# Altium footprint library Connector_Samtec_HLE_SMD.PcbLib: 290 footprints (part 20 of 24)
Each footprint in its own frame and in the unit in brackets; x right, y up, seen from the top. Pads: shape width x height; smd on the part's side, far side on the other; paste and mask are expansions set on the pad; w line width, h text height; cw(c..) or ccw(c..) is an arc to the next point about the centre after c.
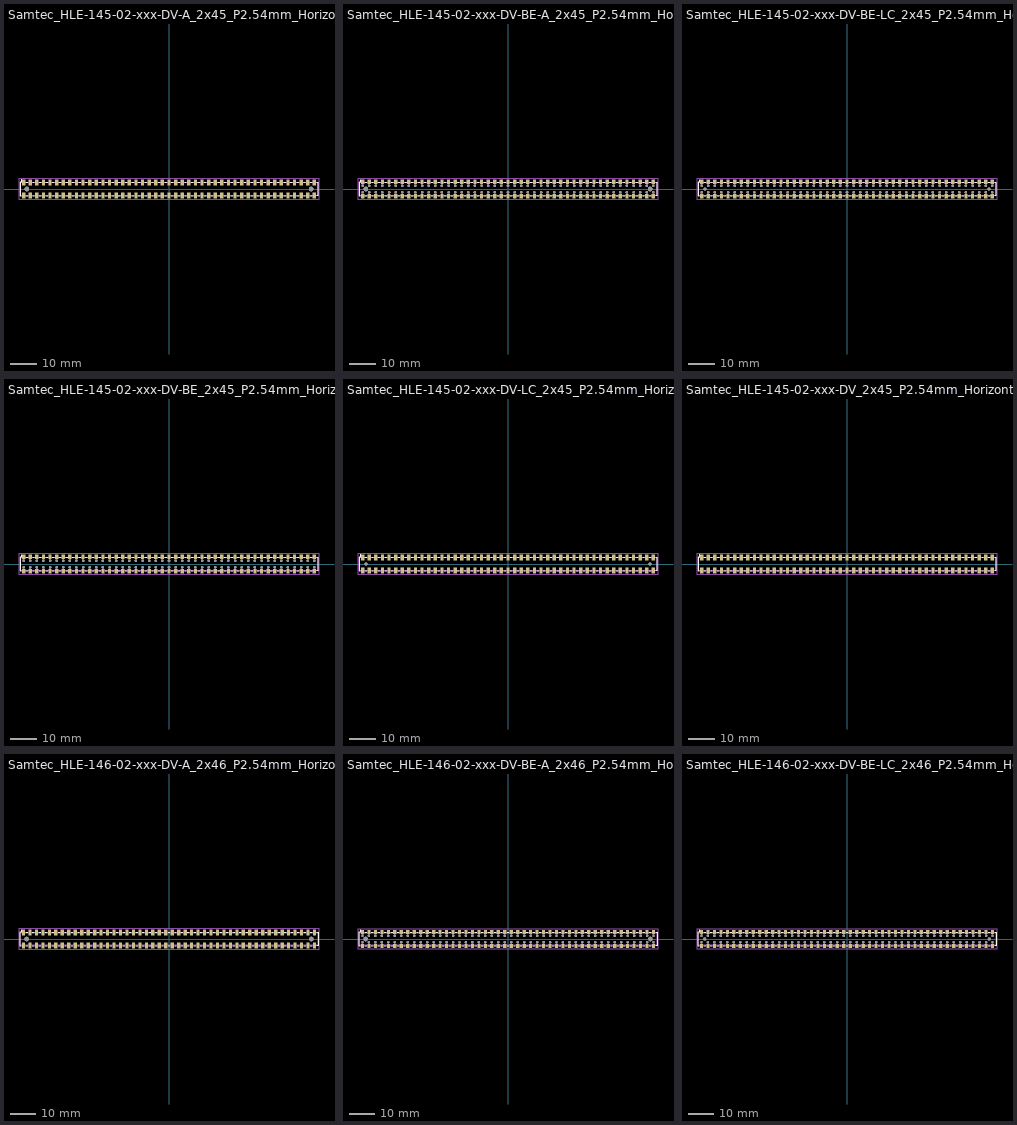
[diagram p19: the footprints below, top view; thin cyan lines are the x and y axes]

## Samtec_HLE-145-02-xxx-DV-A_2x45_P2.54mm_Horizontal [mm]
pads (92):
  rect 1.27x2.29 smd: 1(-55.88,2.525) 2(-55.88,-2.525) 3(-53.34,2.525) 4(-53.34,-2.525) 5(-50.8,2.525) 6(-50.8,-2.525) 7(-48.26,2.525) 8(-48.26,-2.525) 9(-45.72,2.525) 10(-45.72,-2.525) 11(-43.18,2.525) 12(-43.18,-2.525) 13(-40.64,2.525) 14(-40.64,-2.525) 15(-38.1,2.525) 16(-38.1,-2.525) 17(-35.56,2.525) 18(-35.56,-2.525) 19(-33.02,2.525) 20(-33.02,-2.525) 21(-30.48,2.525) 22(-30.48,-2.525) 23(-27.94,2.525) 24(-27.94,-2.525) 25(-25.4,2.525) 26(-25.4,-2.525) 27(-22.86,2.525) 28(-22.86,-2.525) 29(-20.32,2.525) 30(-20.32,-2.525) 31(-17.78,2.525) 32(-17.78,-2.525) 33(-15.24,2.525) 34(-15.24,-2.525) 35(-12.7,2.525) 36(-12.7,-2.525) 37(-10.16,2.525) 38(-10.16,-2.525) 39(-7.62,2.525) 40(-7.62,-2.525) 41(-5.08,2.525) 42(-5.08,-2.525) 43(-2.54,2.525) 44(-2.54,-2.525) 45(0,2.525) 46(0,-2.525) 47(2.54,2.525) 48(2.54,-2.525) 49(5.08,2.525) 50(5.08,-2.525) 51(7.62,2.525) 52(7.62,-2.525) 53(10.16,2.525) 54(10.16,-2.525) 55(12.7,2.525) 56(12.7,-2.525) 57(15.24,2.525) 58(15.24,-2.525) 59(17.78,2.525) 60(17.78,-2.525) 61(20.32,2.525) 62(20.32,-2.525) 63(22.86,2.525) 64(22.86,-2.525) 65(25.4,2.525) 66(25.4,-2.525) 67(27.94,2.525) 68(27.94,-2.525) 69(30.48,2.525) 70(30.48,-2.525) 71(33.02,2.525) 72(33.02,-2.525) 73(35.56,2.525) 74(35.56,-2.525) 75(38.1,2.525) 76(38.1,-2.525) 77(40.64,2.525) 78(40.64,-2.525) 79(43.18,2.525) 80(43.18,-2.525) 81(45.72,2.525) 82(45.72,-2.525) 83(48.26,2.525) 84(48.26,-2.525) 85(50.8,2.525) 86(50.8,-2.525) 87(53.34,2.525) 88(53.34,-2.525) 89(55.88,2.525) 90(55.88,-2.525)
  round 1.78 hole 1.78: Un1(54.61,0) Un2(-54.61,0)
F.SilkS:
  lines w0.12: -56.775,-2.65 -57.26,-2.65 -57.26,2.65 -56.775,2.65 -56.775,3.67 ; -54.985,-2.65 -54.235,-2.65 ; -54.985,2.65 -54.235,2.65 ; -52.445,-2.65 -51.695,-2.65 ; -52.445,2.65 -51.695,2.65 ; -49.905,-2.65 -49.155,-2.65 ; -49.905,2.65 -49.155,2.65 ; -47.365,-2.65 -46.615,-2.65 ; -47.365,2.65 -46.615,2.65 ; -44.825,-2.65 -44.075,-2.65 ; -44.825,2.65 -44.075,2.65 ; -42.285,-2.65 -41.535,-2.65 ; -42.285,2.65 -41.535,2.65 ; -39.745,-2.65 -38.995,-2.65 ; -39.745,2.65 -38.995,2.65 ; -37.205,-2.65 -36.455,-2.65 ; -37.205,2.65 -36.455,2.65 ; -34.665,-2.65 -33.915,-2.65 ; -34.665,2.65 -33.915,2.65 ; -32.125,-2.65 -31.375,-2.65 ; -32.125,2.65 -31.375,2.65 ; -29.585,-2.65 -28.835,-2.65 ; -29.585,2.65 -28.835,2.65 ; -27.045,-2.65 -26.295,-2.65 ; -27.045,2.65 -26.295,2.65 ; -24.505,-2.65 -23.755,-2.65 ; -24.505,2.65 -23.755,2.65 ; -21.965,-2.65 -21.215,-2.65 ; -21.965,2.65 -21.215,2.65 ; -19.425,-2.65 -18.675,-2.65 ; -19.425,2.65 -18.675,2.65 ; -16.885,-2.65 -16.135,-2.65 ; -16.885,2.65 -16.135,2.65 ; -14.345,-2.65 -13.595,-2.65 ; -14.345,2.65 -13.595,2.65 ; -11.805,-2.65 -11.055,-2.65 ; -11.805,2.65 -11.055,2.65 ; -9.265,-2.65 -8.515,-2.65 ; -9.265,2.65 -8.515,2.65 ; -6.725,-2.65 -5.975,-2.65 ; -6.725,2.65 -5.975,2.65 ; -4.185,-2.65 -3.435,-2.65 ; -4.185,2.65 -3.435,2.65 ; -1.645,-2.65 -0.895,-2.65 ; -1.645,2.65 -0.895,2.65 ; 0.895,-2.65 1.645,-2.65 ; 0.895,2.65 1.645,2.65 ; 3.435,-2.65 4.185,-2.65 ; 3.435,2.65 4.185,2.65 ; 5.975,-2.65 6.725,-2.65 ; 5.975,2.65 6.725,2.65 ; 8.515,-2.65 9.265,-2.65 ; 8.515,2.65 9.265,2.65 ; 11.055,-2.65 11.805,-2.65 ; 11.055,2.65 11.805,2.65 ; 13.595,-2.65 14.345,-2.65 ; 13.595,2.65 14.345,2.65 ; 16.135,-2.65 16.885,-2.65 ; 16.135,2.65 16.885,2.65 ; 18.675,-2.65 19.425,-2.65 ; 18.675,2.65 19.425,2.65 ; 21.215,-2.65 21.965,-2.65 ; 21.215,2.65 21.965,2.65 ; 23.755,-2.65 24.505,-2.65 ; 23.755,2.65 24.505,2.65 ; 26.295,-2.65 27.045,-2.65 ; 26.295,2.65 27.045,2.65 ; 28.835,-2.65 29.585,-2.65 ; 28.835,2.65 29.585,2.65 ; 31.375,-2.65 32.125,-2.65 ; 31.375,2.65 32.125,2.65 ; 33.915,-2.65 34.665,-2.65 ; 33.915,2.65 34.665,2.65 ; 36.455,-2.65 37.205,-2.65 ; 36.455,2.65 37.205,2.65 ; 38.995,-2.65 39.745,-2.65 ; 38.995,2.65 39.745,2.65 ; 41.535,-2.65 42.285,-2.65 ; 41.535,2.65 42.285,2.65 ; 44.075,-2.65 44.825,-2.65 ; 44.075,2.65 44.825,2.65 ; 46.615,-2.65 47.365,-2.65 ; 46.615,2.65 47.365,2.65 ; 49.155,-2.65 49.905,-2.65 ; 49.155,2.65 49.905,2.65 ; 51.695,-2.65 52.445,-2.65 ; 51.695,2.65 52.445,2.65 ; 54.235,-2.65 54.985,-2.65 ; 54.235,2.65 54.985,2.65 ; 56.775,-2.65 57.26,-2.65 57.26,2.65 56.775,2.65
F.CrtYd:
  lines w0.05: -57.65,-4.17 57.65,-4.17 57.65,4.17 -57.65,4.17 -57.65,-4.17
F.Fab:
  lines w0.1: -56.38,2.54 -55.88,1.833 -55.38,2.54 ; -57.15,-2.54 -57.15,2.54 57.15,2.54 57.15,-2.54 -57.15,-2.54
  text "'.Designator'" at -4.047,-2.68 h1

## Samtec_HLE-145-02-xxx-DV-BE-A_2x45_P2.54mm_Horizontal [mm]
pads (182):
  rect 1.27x1.68 smd: 1(-55.88,2.72) 2(-55.88,-2.72) 3(-53.34,2.72) 4(-53.34,-2.72) 5(-50.8,2.72) 6(-50.8,-2.72) 7(-48.26,2.72) 8(-48.26,-2.72) 9(-45.72,2.72) 10(-45.72,-2.72) 11(-43.18,2.72) 12(-43.18,-2.72) 13(-40.64,2.72) 14(-40.64,-2.72) 15(-38.1,2.72) 16(-38.1,-2.72) 17(-35.56,2.72) 18(-35.56,-2.72) 19(-33.02,2.72) 20(-33.02,-2.72) 21(-30.48,2.72) 22(-30.48,-2.72) 23(-27.94,2.72) 24(-27.94,-2.72) 25(-25.4,2.72) 26(-25.4,-2.72) 27(-22.86,2.72) 28(-22.86,-2.72) 29(-20.32,2.72) 30(-20.32,-2.72) 31(-17.78,2.72) 32(-17.78,-2.72) 33(-15.24,2.72) 34(-15.24,-2.72) 35(-12.7,2.72) 36(-12.7,-2.72) 37(-10.16,2.72) 38(-10.16,-2.72) 39(-7.62,2.72) 40(-7.62,-2.72) 41(-5.08,2.72) 42(-5.08,-2.72) 43(-2.54,2.72) 44(-2.54,-2.72) 45(0,2.72) 46(0,-2.72) 47(2.54,2.72) 48(2.54,-2.72) 49(5.08,2.72) 50(5.08,-2.72) 51(7.62,2.72) 52(7.62,-2.72) 53(10.16,2.72) 54(10.16,-2.72) 55(12.7,2.72) 56(12.7,-2.72) 57(15.24,2.72) 58(15.24,-2.72) 59(17.78,2.72) 60(17.78,-2.72) 61(20.32,2.72) 62(20.32,-2.72) 63(22.86,2.72) 64(22.86,-2.72) 65(25.4,2.72) 66(25.4,-2.72) 67(27.94,2.72) 68(27.94,-2.72) 69(30.48,2.72) 70(30.48,-2.72) 71(33.02,2.72) 72(33.02,-2.72) 73(35.56,2.72) 74(35.56,-2.72) 75(38.1,2.72) 76(38.1,-2.72) 77(40.64,2.72) 78(40.64,-2.72) 79(43.18,2.72) 80(43.18,-2.72) 81(45.72,2.72) 82(45.72,-2.72) 83(48.26,2.72) 84(48.26,-2.72) 85(50.8,2.72) 86(50.8,-2.72) 87(53.34,2.72) 88(53.34,-2.72) 89(55.88,2.72) 90(55.88,-2.72)
  round 0.97 hole 0.97: Un1(55.88,1.27) Un2(-55.88,1.27) Un3(-50.8,1.27) Un4(2.54,1.27) Un5(45.72,1.27) Un6(22.86,1.27) Un7(2.54,-1.27) Un8(5.08,1.27) Un9(-25.4,1.27) Un10(15.24,1.27) Un11(33.02,1.27) Un12(-10.16,-1.27) Un13(20.32,-1.27) Un14(-55.88,-1.27) Un15(27.94,1.27) Un16(-20.32,1.27) Un17(50.8,-1.27) Un18(-38.1,-1.27) Un19(-38.1,1.27) Un20(-30.48,-1.27) Un21(-17.78,-1.27) Un22(-45.72,1.27) Un23(17.78,-1.27) Un24(40.64,-1.27) Un25(-12.7,-1.27) Un26(43.18,1.27) Un27(7.62,-1.27) Un28(-40.64,1.27) Un29(33.02,-1.27) Un31(-53.34,-1.27) Un32(-35.56,-1.27) Un33(10.16,1.27) Un34(15.24,-1.27) Un35(-7.62,-1.27) Un36(-48.26,-1.27) Un37(-2.54,-1.27) Un38(50.8,1.27) Un39(-33.02,-1.27) Un40(20.32,1.27) Un41(-5.08,-1.27) Un42(-53.34,1.27) Un43(45.72,-1.27) Un44(0,-1.27) Un45(55.88,-1.27) Un46(35.56,1.27) Un48(17.78,1.27) Un49(-15.24,1.27) Un50(30.48,1.27) Un51(-22.86,-1.27) Un52(-20.32,-1.27) Un53(-30.48,1.27) Un54(-35.56,1.27) Un55(-22.86,1.27) Un56(-45.72,-1.27) Un57(5.08,-1.27) Un58(-27.94,1.27) Un59(12.7,1.27) Un60(30.48,-1.27) Un61(-43.18,1.27) Un62(0,1.27) Un63(53.34,1.27) Un64(-50.8,-1.27) Un65(-5.08,1.27) Un66(-7.62,1.27) Un67(53.34,-1.27) Un68(35.56,-1.27) Un69(40.64,1.27) Un70(48.26,1.27) Un71(38.1,1.27) Un72(-40.64,-1.27) Un73(-17.78,1.27) Un74(38.1,-1.27) Un75(43.18,-1.27) Un76(48.26,-1.27) Un77(-15.24,-1.27) Un78(27.94,-1.27) Un79(-12.7,1.27) Un80(-25.4,-1.27) Un81(25.4,-1.27) Un82(-43.18,-1.27) Un83(-48.26,1.27) Un84(-27.94,-1.27) Un85(-2.54,1.27) Un86(7.62,1.27) Un87(-10.16,1.27) Un88(-33.02,1.27) Un89(22.86,-1.27) Un90(12.7,-1.27) Un91(10.16,-1.27) Un92(25.4,1.27)
  round 1.78 hole 1.78: Un30(54.61,0) Un47(-54.61,0)
F.SilkS:
  lines w0.12: -56.775,-2.65 -57.26,-2.65 -57.26,2.65 -56.775,2.65 -56.775,3.56 ; -54.985,-2.65 -54.235,-2.65 ; -54.985,2.65 -54.235,2.65 ; -52.445,-2.65 -51.695,-2.65 ; -52.445,2.65 -51.695,2.65 ; -49.905,-2.65 -49.155,-2.65 ; -49.905,2.65 -49.155,2.65 ; -47.365,-2.65 -46.615,-2.65 ; -47.365,2.65 -46.615,2.65 ; -44.825,-2.65 -44.075,-2.65 ; -44.825,2.65 -44.075,2.65 ; -42.285,-2.65 -41.535,-2.65 ; -42.285,2.65 -41.535,2.65 ; -39.745,-2.65 -38.995,-2.65 ; -39.745,2.65 -38.995,2.65 ; -37.205,-2.65 -36.455,-2.65 ; -37.205,2.65 -36.455,2.65 ; -34.665,-2.65 -33.915,-2.65 ; -34.665,2.65 -33.915,2.65 ; -32.125,-2.65 -31.375,-2.65 ; -32.125,2.65 -31.375,2.65 ; -29.585,-2.65 -28.835,-2.65 ; -29.585,2.65 -28.835,2.65 ; -27.045,-2.65 -26.295,-2.65 ; -27.045,2.65 -26.295,2.65 ; -24.505,-2.65 -23.755,-2.65 ; -24.505,2.65 -23.755,2.65 ; -21.965,-2.65 -21.215,-2.65 ; -21.965,2.65 -21.215,2.65 ; -19.425,-2.65 -18.675,-2.65 ; -19.425,2.65 -18.675,2.65 ; -16.885,-2.65 -16.135,-2.65 ; -16.885,2.65 -16.135,2.65 ; -14.345,-2.65 -13.595,-2.65 ; -14.345,2.65 -13.595,2.65 ; -11.805,-2.65 -11.055,-2.65 ; -11.805,2.65 -11.055,2.65 ; -9.265,-2.65 -8.515,-2.65 ; -9.265,2.65 -8.515,2.65 ; -6.725,-2.65 -5.975,-2.65 ; -6.725,2.65 -5.975,2.65 ; -4.185,-2.65 -3.435,-2.65 ; -4.185,2.65 -3.435,2.65 ; -1.645,-2.65 -0.895,-2.65 ; -1.645,2.65 -0.895,2.65 ; 0.895,-2.65 1.645,-2.65 ; 0.895,2.65 1.645,2.65 ; 3.435,-2.65 4.185,-2.65 ; 3.435,2.65 4.185,2.65 ; 5.975,-2.65 6.725,-2.65 ; 5.975,2.65 6.725,2.65 ; 8.515,-2.65 9.265,-2.65 ; 8.515,2.65 9.265,2.65 ; 11.055,-2.65 11.805,-2.65 ; 11.055,2.65 11.805,2.65 ; 13.595,-2.65 14.345,-2.65 ; 13.595,2.65 14.345,2.65 ; 16.135,-2.65 16.885,-2.65 ; 16.135,2.65 16.885,2.65 ; 18.675,-2.65 19.425,-2.65 ; 18.675,2.65 19.425,2.65 ; 21.215,-2.65 21.965,-2.65 ; 21.215,2.65 21.965,2.65 ; 23.755,-2.65 24.505,-2.65 ; 23.755,2.65 24.505,2.65 ; 26.295,-2.65 27.045,-2.65 ; 26.295,2.65 27.045,2.65 ; 28.835,-2.65 29.585,-2.65 ; 28.835,2.65 29.585,2.65 ; 31.375,-2.65 32.125,-2.65 ; 31.375,2.65 32.125,2.65 ; 33.915,-2.65 34.665,-2.65 ; 33.915,2.65 34.665,2.65 ; 36.455,-2.65 37.205,-2.65 ; 36.455,2.65 37.205,2.65 ; 38.995,-2.65 39.745,-2.65 ; 38.995,2.65 39.745,2.65 ; 41.535,-2.65 42.285,-2.65 ; 41.535,2.65 42.285,2.65 ; 44.075,-2.65 44.825,-2.65 ; 44.075,2.65 44.825,2.65 ; 46.615,-2.65 47.365,-2.65 ; 46.615,2.65 47.365,2.65 ; 49.155,-2.65 49.905,-2.65 ; 49.155,2.65 49.905,2.65 ; 51.695,-2.65 52.445,-2.65 ; 51.695,2.65 52.445,2.65 ; 54.235,-2.65 54.985,-2.65 ; 54.235,2.65 54.985,2.65 ; 56.775,-2.65 57.26,-2.65 57.26,2.65 56.775,2.65
F.CrtYd:
  lines w0.05: -57.65,-4.06 -57.65,4.06 57.65,4.06 57.65,-4.06 -57.65,-4.06
F.Fab:
  lines w0.1: -56.38,2.54 -55.88,1.833 -55.38,2.54 ; -57.15,-2.54 -57.15,2.54 57.15,2.54 57.15,-2.54 -57.15,-2.54
  text "'.Designator'" at -4.047,-2.68 h1

## Samtec_HLE-145-02-xxx-DV-BE-LC_2x45_P2.54mm_Horizontal [mm]
pads (182):
  rect 1.27x1.68 smd: 1(-55.88,2.72) 2(-55.88,-2.72) 3(-53.34,2.72) 4(-53.34,-2.72) 5(-50.8,2.72) 6(-50.8,-2.72) 7(-48.26,2.72) 8(-48.26,-2.72) 9(-45.72,2.72) 10(-45.72,-2.72) 11(-43.18,2.72) 12(-43.18,-2.72) 13(-40.64,2.72) 14(-40.64,-2.72) 15(-38.1,2.72) 16(-38.1,-2.72) 17(-35.56,2.72) 18(-35.56,-2.72) 19(-33.02,2.72) 20(-33.02,-2.72) 21(-30.48,2.72) 22(-30.48,-2.72) 23(-27.94,2.72) 24(-27.94,-2.72) 25(-25.4,2.72) 26(-25.4,-2.72) 27(-22.86,2.72) 28(-22.86,-2.72) 29(-20.32,2.72) 30(-20.32,-2.72) 31(-17.78,2.72) 32(-17.78,-2.72) 33(-15.24,2.72) 34(-15.24,-2.72) 35(-12.7,2.72) 36(-12.7,-2.72) 37(-10.16,2.72) 38(-10.16,-2.72) 39(-7.62,2.72) 40(-7.62,-2.72) 41(-5.08,2.72) 42(-5.08,-2.72) 43(-2.54,2.72) 44(-2.54,-2.72) 45(0,2.72) 46(0,-2.72) 47(2.54,2.72) 48(2.54,-2.72) 49(5.08,2.72) 50(5.08,-2.72) 51(7.62,2.72) 52(7.62,-2.72) 53(10.16,2.72) 54(10.16,-2.72) 55(12.7,2.72) 56(12.7,-2.72) 57(15.24,2.72) 58(15.24,-2.72) 59(17.78,2.72) 60(17.78,-2.72) 61(20.32,2.72) 62(20.32,-2.72) 63(22.86,2.72) 64(22.86,-2.72) 65(25.4,2.72) 66(25.4,-2.72) 67(27.94,2.72) 68(27.94,-2.72) 69(30.48,2.72) 70(30.48,-2.72) 71(33.02,2.72) 72(33.02,-2.72) 73(35.56,2.72) 74(35.56,-2.72) 75(38.1,2.72) 76(38.1,-2.72) 77(40.64,2.72) 78(40.64,-2.72) 79(43.18,2.72) 80(43.18,-2.72) 81(45.72,2.72) 82(45.72,-2.72) 83(48.26,2.72) 84(48.26,-2.72) 85(50.8,2.72) 86(50.8,-2.72) 87(53.34,2.72) 88(53.34,-2.72) 89(55.88,2.72) 90(55.88,-2.72)
  round 0.97 hole 0.97: Un1(20.32,-1.27) Un2(30.48,1.27) Un3(-35.56,-1.27) Un4(50.8,1.27) Un5(-48.26,1.27) Un6(33.02,-1.27) Un7(-40.64,-1.27) Un8(10.16,1.27) Un10(0,1.27) Un11(20.32,1.27) Un12(55.88,-1.27) Un13(-5.08,1.27) Un14(38.1,1.27) Un15(-55.88,-1.27) Un16(55.88,1.27) Un17(12.7,-1.27) Un18(2.54,1.27) Un19(43.18,1.27) Un20(-7.62,-1.27) Un21(25.4,-1.27) Un22(40.64,1.27) Un23(-38.1,1.27) Un24(-17.78,-1.27) Un25(-15.24,1.27) Un26(-12.7,-1.27) Un27(-55.88,1.27) Un28(-30.48,1.27) Un29(-38.1,-1.27) Un30(48.26,1.27) Un31(-10.16,-1.27) Un33(45.72,1.27) Un34(-33.02,-1.27) Un35(53.34,1.27) Un36(53.34,-1.27) Un37(-43.18,1.27) Un38(-7.62,1.27) Un39(45.72,-1.27) Un40(-40.64,1.27) Un41(27.94,-1.27) Un42(35.56,-1.27) Un43(-22.86,-1.27) Un44(35.56,1.27) Un45(27.94,1.27) Un46(38.1,-1.27) Un47(10.16,-1.27) Un48(-50.8,1.27) Un49(-17.78,1.27) Un50(-25.4,1.27) Un51(2.54,-1.27) Un52(-10.16,1.27) Un53(-22.86,1.27) Un54(-2.54,1.27) Un55(-27.94,1.27) Un56(12.7,1.27) Un57(25.4,1.27) Un58(5.08,-1.27) Un59(30.48,-1.27) Un60(-35.56,1.27) Un61(48.26,-1.27) Un62(-53.34,-1.27) Un63(5.08,1.27) Un64(33.02,1.27) Un65(-15.24,-1.27) Un66(-25.4,-1.27) Un67(0,-1.27) Un68(17.78,-1.27) Un69(-45.72,-1.27) Un70(-33.02,1.27) Un71(-12.7,1.27) Un72(40.64,-1.27) Un73(15.24,-1.27) Un74(15.24,1.27) Un75(7.62,-1.27) Un76(-50.8,-1.27) Un77(-2.54,-1.27) Un78(17.78,1.27) Un79(-53.34,1.27) Un80(43.18,-1.27) Un81(-20.32,1.27) Un82(-20.32,-1.27) Un83(7.62,1.27) Un84(-27.94,-1.27) Un85(50.8,-1.27) Un86(-43.18,-1.27) Un87(22.86,1.27) Un88(-45.72,1.27) Un89(-5.08,-1.27) Un90(-30.48,-1.27) Un91(22.86,-1.27) Un92(-48.26,-1.27)
  round 1.19 hole 1.19: Un9(-54.61,0) Un32(54.61,0)
F.SilkS:
  lines w0.12: -56.775,-2.65 -57.26,-2.65 -57.26,2.65 -56.775,2.65 -56.775,3.56 ; -54.985,-2.65 -54.235,-2.65 ; -54.985,2.65 -54.235,2.65 ; -52.445,-2.65 -51.695,-2.65 ; -52.445,2.65 -51.695,2.65 ; -49.905,-2.65 -49.155,-2.65 ; -49.905,2.65 -49.155,2.65 ; -47.365,-2.65 -46.615,-2.65 ; -47.365,2.65 -46.615,2.65 ; -44.825,-2.65 -44.075,-2.65 ; -44.825,2.65 -44.075,2.65 ; -42.285,-2.65 -41.535,-2.65 ; -42.285,2.65 -41.535,2.65 ; -39.745,-2.65 -38.995,-2.65 ; -39.745,2.65 -38.995,2.65 ; -37.205,-2.65 -36.455,-2.65 ; -37.205,2.65 -36.455,2.65 ; -34.665,-2.65 -33.915,-2.65 ; -34.665,2.65 -33.915,2.65 ; -32.125,-2.65 -31.375,-2.65 ; -32.125,2.65 -31.375,2.65 ; -29.585,-2.65 -28.835,-2.65 ; -29.585,2.65 -28.835,2.65 ; -27.045,-2.65 -26.295,-2.65 ; -27.045,2.65 -26.295,2.65 ; -24.505,-2.65 -23.755,-2.65 ; -24.505,2.65 -23.755,2.65 ; -21.965,-2.65 -21.215,-2.65 ; -21.965,2.65 -21.215,2.65 ; -19.425,-2.65 -18.675,-2.65 ; -19.425,2.65 -18.675,2.65 ; -16.885,-2.65 -16.135,-2.65 ; -16.885,2.65 -16.135,2.65 ; -14.345,-2.65 -13.595,-2.65 ; -14.345,2.65 -13.595,2.65 ; -11.805,-2.65 -11.055,-2.65 ; -11.805,2.65 -11.055,2.65 ; -9.265,-2.65 -8.515,-2.65 ; -9.265,2.65 -8.515,2.65 ; -6.725,-2.65 -5.975,-2.65 ; -6.725,2.65 -5.975,2.65 ; -4.185,-2.65 -3.435,-2.65 ; -4.185,2.65 -3.435,2.65 ; -1.645,-2.65 -0.895,-2.65 ; -1.645,2.65 -0.895,2.65 ; 0.895,-2.65 1.645,-2.65 ; 0.895,2.65 1.645,2.65 ; 3.435,-2.65 4.185,-2.65 ; 3.435,2.65 4.185,2.65 ; 5.975,-2.65 6.725,-2.65 ; 5.975,2.65 6.725,2.65 ; 8.515,-2.65 9.265,-2.65 ; 8.515,2.65 9.265,2.65 ; 11.055,-2.65 11.805,-2.65 ; 11.055,2.65 11.805,2.65 ; 13.595,-2.65 14.345,-2.65 ; 13.595,2.65 14.345,2.65 ; 16.135,-2.65 16.885,-2.65 ; 16.135,2.65 16.885,2.65 ; 18.675,-2.65 19.425,-2.65 ; 18.675,2.65 19.425,2.65 ; 21.215,-2.65 21.965,-2.65 ; 21.215,2.65 21.965,2.65 ; 23.755,-2.65 24.505,-2.65 ; 23.755,2.65 24.505,2.65 ; 26.295,-2.65 27.045,-2.65 ; 26.295,2.65 27.045,2.65 ; 28.835,-2.65 29.585,-2.65 ; 28.835,2.65 29.585,2.65 ; 31.375,-2.65 32.125,-2.65 ; 31.375,2.65 32.125,2.65 ; 33.915,-2.65 34.665,-2.65 ; 33.915,2.65 34.665,2.65 ; 36.455,-2.65 37.205,-2.65 ; 36.455,2.65 37.205,2.65 ; 38.995,-2.65 39.745,-2.65 ; 38.995,2.65 39.745,2.65 ; 41.535,-2.65 42.285,-2.65 ; 41.535,2.65 42.285,2.65 ; 44.075,-2.65 44.825,-2.65 ; 44.075,2.65 44.825,2.65 ; 46.615,-2.65 47.365,-2.65 ; 46.615,2.65 47.365,2.65 ; 49.155,-2.65 49.905,-2.65 ; 49.155,2.65 49.905,2.65 ; 51.695,-2.65 52.445,-2.65 ; 51.695,2.65 52.445,2.65 ; 54.235,-2.65 54.985,-2.65 ; 54.235,2.65 54.985,2.65 ; 56.775,-2.65 57.26,-2.65 57.26,2.65 56.775,2.65
F.CrtYd:
  lines w0.05: -57.65,-4.06 57.65,-4.06 57.65,4.06 -57.65,4.06 -57.65,-4.06
F.Fab:
  lines w0.1: -56.38,2.54 -55.88,1.833 -55.38,2.54 ; -57.15,-2.54 57.15,-2.54 57.15,2.54 -57.15,2.54 -57.15,-2.54
  text "'.Designator'" at -4.047,-2.68 h1

## Samtec_HLE-145-02-xxx-DV-BE_2x45_P2.54mm_Horizontal [mm]
pads (180):
  rect 1.27x1.68 smd: 1(-55.88,2.72) 2(-55.88,-2.72) 3(-53.34,2.72) 4(-53.34,-2.72) 5(-50.8,2.72) 6(-50.8,-2.72) 7(-48.26,2.72) 8(-48.26,-2.72) 9(-45.72,2.72) 10(-45.72,-2.72) 11(-43.18,2.72) 12(-43.18,-2.72) 13(-40.64,2.72) 14(-40.64,-2.72) 15(-38.1,2.72) 16(-38.1,-2.72) 17(-35.56,2.72) 18(-35.56,-2.72) 19(-33.02,2.72) 20(-33.02,-2.72) 21(-30.48,2.72) 22(-30.48,-2.72) 23(-27.94,2.72) 24(-27.94,-2.72) 25(-25.4,2.72) 26(-25.4,-2.72) 27(-22.86,2.72) 28(-22.86,-2.72) 29(-20.32,2.72) 30(-20.32,-2.72) 31(-17.78,2.72) 32(-17.78,-2.72) 33(-15.24,2.72) 34(-15.24,-2.72) 35(-12.7,2.72) 36(-12.7,-2.72) 37(-10.16,2.72) 38(-10.16,-2.72) 39(-7.62,2.72) 40(-7.62,-2.72) 41(-5.08,2.72) 42(-5.08,-2.72) 43(-2.54,2.72) 44(-2.54,-2.72) 45(0,2.72) 46(0,-2.72) 47(2.54,2.72) 48(2.54,-2.72) 49(5.08,2.72) 50(5.08,-2.72) 51(7.62,2.72) 52(7.62,-2.72) 53(10.16,2.72) 54(10.16,-2.72) 55(12.7,2.72) 56(12.7,-2.72) 57(15.24,2.72) 58(15.24,-2.72) 59(17.78,2.72) 60(17.78,-2.72) 61(20.32,2.72) 62(20.32,-2.72) 63(22.86,2.72) 64(22.86,-2.72) 65(25.4,2.72) 66(25.4,-2.72) 67(27.94,2.72) 68(27.94,-2.72) 69(30.48,2.72) 70(30.48,-2.72) 71(33.02,2.72) 72(33.02,-2.72) 73(35.56,2.72) 74(35.56,-2.72) 75(38.1,2.72) 76(38.1,-2.72) 77(40.64,2.72) 78(40.64,-2.72) 79(43.18,2.72) 80(43.18,-2.72) 81(45.72,2.72) 82(45.72,-2.72) 83(48.26,2.72) 84(48.26,-2.72) 85(50.8,2.72) 86(50.8,-2.72) 87(53.34,2.72) 88(53.34,-2.72) 89(55.88,2.72) 90(55.88,-2.72)
  round 0.97 hole 0.97: Un1(-15.24,-1.27) Un2(-38.1,1.27) Un3(0,-1.27) Un4(-50.8,1.27) Un5(-45.72,-1.27) Un6(-55.88,-1.27) Un7(12.7,1.27) Un8(-27.94,-1.27) Un9(35.56,-1.27) Un10(40.64,-1.27) Un11(-38.1,-1.27) Un12(-50.8,-1.27) Un13(35.56,1.27) Un14(-12.7,-1.27) Un15(20.32,-1.27) Un16(27.94,-1.27) Un17(-55.88,1.27) Un18(7.62,-1.27) Un19(20.32,1.27) Un20(-22.86,1.27) Un21(5.08,-1.27) Un22(-2.54,1.27) Un23(38.1,-1.27) Un24(-7.62,-1.27) Un25(10.16,-1.27) Un26(-22.86,-1.27) Un27(-53.34,1.27) Un28(-40.64,1.27) Un29(55.88,-1.27) Un30(-17.78,-1.27) Un31(-15.24,1.27) Un32(-20.32,1.27) Un33(-40.64,-1.27) Un34(53.34,1.27) Un35(-43.18,1.27) Un36(45.72,-1.27) Un37(22.86,-1.27) Un38(-5.08,-1.27) Un39(50.8,1.27) Un40(5.08,1.27) Un41(-35.56,1.27) Un42(-43.18,-1.27) Un43(48.26,-1.27) Un44(43.18,1.27) Un45(27.94,1.27) Un46(33.02,-1.27) Un47(55.88,1.27) Un48(25.4,1.27) Un49(-30.48,-1.27) Un50(-10.16,1.27) Un51(-33.02,-1.27) Un52(53.34,-1.27) Un53(-53.34,-1.27) Un54(-30.48,1.27) Un55(0,1.27) Un56(-27.94,1.27) Un57(48.26,1.27) Un58(-12.7,1.27) Un59(-10.16,-1.27) Un60(-35.56,-1.27) Un61(22.86,1.27) Un62(10.16,1.27) Un63(30.48,-1.27) Un64(50.8,-1.27) Un65(2.54,-1.27) Un66(17.78,1.27) Un67(-25.4,-1.27) Un68(-17.78,1.27) Un69(15.24,-1.27) Un70(-5.08,1.27) Un71(17.78,-1.27) Un72(12.7,-1.27) Un73(-33.02,1.27) Un74(33.02,1.27) Un75(45.72,1.27) Un76(25.4,-1.27) Un77(7.62,1.27) Un78(30.48,1.27) Un79(40.64,1.27) Un80(2.54,1.27) Un81(-7.62,1.27) Un82(15.24,1.27) Un83(-45.72,1.27) Un84(38.1,1.27) Un85(-2.54,-1.27) Un86(43.18,-1.27) Un87(-48.26,-1.27) Un88(-25.4,1.27) Un89(-20.32,-1.27) Un90(-48.26,1.27)
F.SilkS:
  lines w0.12: -56.775,-2.65 -57.26,-2.65 -57.26,2.65 -56.775,2.65 -56.775,3.56 ; -54.985,-2.65 -54.235,-2.65 ; -54.985,2.65 -54.235,2.65 ; -52.445,-2.65 -51.695,-2.65 ; -52.445,2.65 -51.695,2.65 ; -49.905,-2.65 -49.155,-2.65 ; -49.905,2.65 -49.155,2.65 ; -47.365,-2.65 -46.615,-2.65 ; -47.365,2.65 -46.615,2.65 ; -44.825,-2.65 -44.075,-2.65 ; -44.825,2.65 -44.075,2.65 ; -42.285,-2.65 -41.535,-2.65 ; -42.285,2.65 -41.535,2.65 ; -39.745,-2.65 -38.995,-2.65 ; -39.745,2.65 -38.995,2.65 ; -37.205,-2.65 -36.455,-2.65 ; -37.205,2.65 -36.455,2.65 ; -34.665,-2.65 -33.915,-2.65 ; -34.665,2.65 -33.915,2.65 ; -32.125,-2.65 -31.375,-2.65 ; -32.125,2.65 -31.375,2.65 ; -29.585,-2.65 -28.835,-2.65 ; -29.585,2.65 -28.835,2.65 ; -27.045,-2.65 -26.295,-2.65 ; -27.045,2.65 -26.295,2.65 ; -24.505,-2.65 -23.755,-2.65 ; -24.505,2.65 -23.755,2.65 ; -21.965,-2.65 -21.215,-2.65 ; -21.965,2.65 -21.215,2.65 ; -19.425,-2.65 -18.675,-2.65 ; -19.425,2.65 -18.675,2.65 ; -16.885,-2.65 -16.135,-2.65 ; -16.885,2.65 -16.135,2.65 ; -14.345,-2.65 -13.595,-2.65 ; -14.345,2.65 -13.595,2.65 ; -11.805,-2.65 -11.055,-2.65 ; -11.805,2.65 -11.055,2.65 ; -9.265,-2.65 -8.515,-2.65 ; -9.265,2.65 -8.515,2.65 ; -6.725,-2.65 -5.975,-2.65 ; -6.725,2.65 -5.975,2.65 ; -4.185,-2.65 -3.435,-2.65 ; -4.185,2.65 -3.435,2.65 ; -1.645,-2.65 -0.895,-2.65 ; -1.645,2.65 -0.895,2.65 ; 0.895,-2.65 1.645,-2.65 ; 0.895,2.65 1.645,2.65 ; 3.435,-2.65 4.185,-2.65 ; 3.435,2.65 4.185,2.65 ; 5.975,-2.65 6.725,-2.65 ; 5.975,2.65 6.725,2.65 ; 8.515,-2.65 9.265,-2.65 ; 8.515,2.65 9.265,2.65 ; 11.055,-2.65 11.805,-2.65 ; 11.055,2.65 11.805,2.65 ; 13.595,-2.65 14.345,-2.65 ; 13.595,2.65 14.345,2.65 ; 16.135,-2.65 16.885,-2.65 ; 16.135,2.65 16.885,2.65 ; 18.675,-2.65 19.425,-2.65 ; 18.675,2.65 19.425,2.65 ; 21.215,-2.65 21.965,-2.65 ; 21.215,2.65 21.965,2.65 ; 23.755,-2.65 24.505,-2.65 ; 23.755,2.65 24.505,2.65 ; 26.295,-2.65 27.045,-2.65 ; 26.295,2.65 27.045,2.65 ; 28.835,-2.65 29.585,-2.65 ; 28.835,2.65 29.585,2.65 ; 31.375,-2.65 32.125,-2.65 ; 31.375,2.65 32.125,2.65 ; 33.915,-2.65 34.665,-2.65 ; 33.915,2.65 34.665,2.65 ; 36.455,-2.65 37.205,-2.65 ; 36.455,2.65 37.205,2.65 ; 38.995,-2.65 39.745,-2.65 ; 38.995,2.65 39.745,2.65 ; 41.535,-2.65 42.285,-2.65 ; 41.535,2.65 42.285,2.65 ; 44.075,-2.65 44.825,-2.65 ; 44.075,2.65 44.825,2.65 ; 46.615,-2.65 47.365,-2.65 ; 46.615,2.65 47.365,2.65 ; 49.155,-2.65 49.905,-2.65 ; 49.155,2.65 49.905,2.65 ; 51.695,-2.65 52.445,-2.65 ; 51.695,2.65 52.445,2.65 ; 54.235,-2.65 54.985,-2.65 ; 54.235,2.65 54.985,2.65 ; 56.775,-2.65 57.26,-2.65 57.26,2.65 56.775,2.65
F.CrtYd:
  lines w0.05: -57.65,-4.06 57.65,-4.06 57.65,4.06 -57.65,4.06 -57.65,-4.06
F.Fab:
  lines w0.1: -56.38,2.54 -55.88,1.833 -55.38,2.54 ; -57.15,-2.54 57.15,-2.54 57.15,2.54 -57.15,2.54 -57.15,-2.54
  text "'.Designator'" at -4.047,-2.68 h1
